# Altium footprint library BBC_Connectors.PcbLib: 141 footprints (part 8 of 9)
Each footprint in its own frame and in the unit in brackets; x right, y up, seen from the top. Pads: shape width x height; smd on the part's side, far side on the other; paste and mask are expansions set on the pad; w line width, h text height; cw(c..) or ccw(c..) is an arc to the next point about the centre after c.
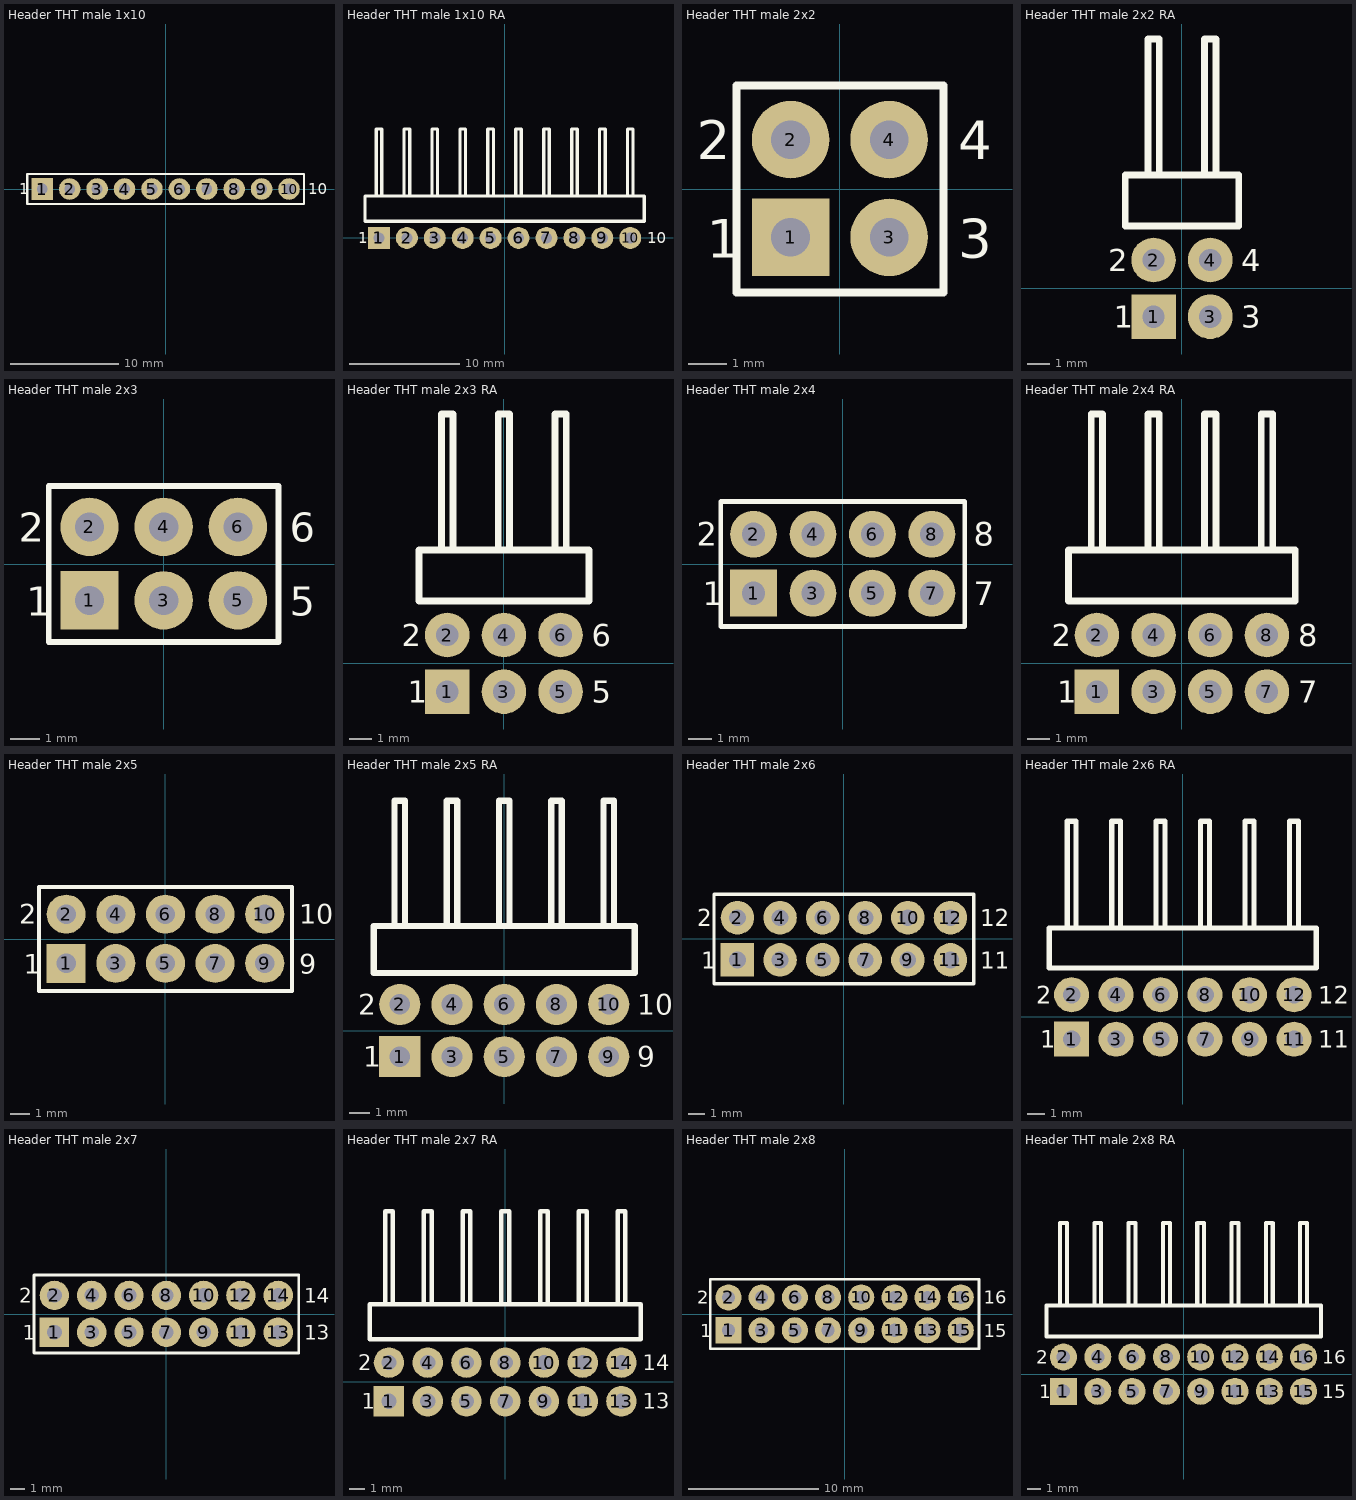
[diagram p7: the footprints below, top view; thin cyan lines are the x and y axes]

## Header THT male 1x10 [mm] "header for tht mounting / pitch = 2.54mm"
height 9
pads (10):
  rect 2x2 hole 1: 1(-11.43,0)
  round 2 hole 1: 2(-8.89,0) 3(-6.35,0) 4(-3.81,0) 5(-1.27,0) 6(1.27,0) 7(3.81,0) 8(6.35,0) 9(8.89,0) 10(11.43,0)
Top Overlay:
  lines w0.2: -12.827,-1.397 12.827,-1.397 12.827,1.397 -12.827,1.397 -12.827,-1.397
  text "1" at -13.589,-0.5 h1
  text "10" at 13.208,-0.5 h1
3D body: height 2.51, standoff -3, extent 2.54,3.81 2.54,3.81
3D body "Header THT 1x10.STEP": height 8.54, standoff -3, extent -12.7,-1.245 12.7,1.245

## Header THT male 1x10 RA [mm] "right angle header for tht mounting / pitch = 2.54mm"
height 2.5
pads (10):
  rect 2x2 hole 1: 1(-11.43,0)
  round 2 hole 1: 2(-8.89,0) 3(-6.35,0) 4(-3.81,0) 5(-1.27,0) 6(1.27,0) 7(3.81,0) 8(6.35,0) 9(8.89,0) 10(11.43,0)
Top Overlay:
  lines w0.3: -11.684,3.81 -11.684,9.906 -11.176,9.906 -11.176,3.81 ; -9.144,3.81 -9.144,9.906 -8.636,9.906 -8.636,3.81 ; -6.604,3.81 -6.604,9.906 -6.096,9.906 -6.096,3.81 ; -4.064,3.81 -4.064,9.906 -3.556,9.906 -3.556,3.81 ; -1.524,3.81 -1.524,9.906 -1.016,9.906 -1.016,3.81 ; 1.016,3.81 1.016,9.906 1.524,9.906 1.524,3.81 ; 3.556,3.81 3.556,9.906 4.064,9.906 4.064,3.81 ; 6.096,3.81 6.096,9.906 6.604,9.906 6.604,3.81 ; 8.636,3.81 8.636,9.906 9.144,9.906 9.144,3.81 ; 11.176,3.81 11.176,9.906 11.684,9.906 11.684,3.81 ; -12.7,1.524 -12.7,3.81 12.7,3.81 12.7,1.524 -12.7,1.524
  text "10" at 12.954,-0.5 h1
  text "1" at -13.335,-0.5 h1
3D body "Header THT 1x10 RA.STEP": height 2.51, standoff -3, extent -12.7,-0.32 12.7,9.81

## Header THT male 2x2 [mm] "header for tht mounting / pitch = 2.54mm"
height 9
pads (4):
  rect 2x2 hole 1: 1(-1.27,-1.245)
  round 2 hole 1: 2(-1.27,1.27) 3(1.27,-1.245) 4(1.27,1.27)
Top Overlay:
  lines w0.2: -2.667,-2.667 -2.667,2.667 2.667,2.667 2.667,-2.667 -2.667,-2.667
  text "2" at -3.683,0.77 h1
  text "4" at 3.048,0.77 h1
  text "3" at 3.048,-1.77 h1
  text "1" at -3.429,-1.77 h1
3D body: height 2.51, standoff -3, extent 2.54,3.81 2.54,3.81
3D body "Header THT male 2x2.step": height 8.54, standoff -3, extent -2.54,-2.49 2.54,2.5

## Header THT male 2x2 RA [mm] "right angle header for tht mounting / pitch = 2.54mm"
height 2.5
pads (4):
  rect 2x2 hole 1: 1(-1.27,-1.27)
  round 2 hole 1: 2(-1.27,1.27) 3(1.27,-1.27) 4(1.27,1.27)
Top Overlay:
  lines w0.3: -1.524,5.08 -1.524,11.176 -1.016,11.176 -1.016,5.08 ; 1.016,5.08 1.016,11.176 1.524,11.176 1.524,5.08 ; -2.54,2.794 2.54,2.794 2.54,5.08 -2.54,5.08 -2.54,2.794
  text "1" at -3.048,-1.77 h1
  text "2" at -3.302,0.77 h1
  text "4" at 2.667,0.77 h1
  text "3" at 2.667,-1.77 h1
3D body "Header THT 2x2 RA.step": height 5.01, standoff -3, extent -2.54,-1.55 2.54,11.08

## Header THT male 2x3 [mm] "header for tht mounting / pitch = 2.54mm"
height 9
pads (6):
  rect 2x2 hole 1: 1(-2.54,-1.245)
  round 2 hole 1: 2(-2.54,1.27) 3(0,-1.245) 4(0,1.27) 5(2.54,-1.245) 6(2.54,1.27)
Top Overlay:
  lines w0.2: -3.937,-2.667 3.937,-2.667 3.937,2.667 -3.937,2.667 -3.937,-2.667
  text "1" at -4.699,-1.77 h1
  text "5" at 4.318,-1.77 h1
  text "6" at 4.318,0.77 h1
  text "2" at -4.953,0.77 h1
3D body: height 2.51, standoff -3, extent 2.54,3.81 2.54,3.81
3D body "Header THT 2x3.step": height 8.54, standoff -3, extent -3.81,-2.49 3.81,2.5

## Header THT male 2x3 RA [mm] "right angle header for tht mounting / pitch = 2.54mm"
height 2.5
pads (6):
  rect 2x2 hole 1: 1(-2.54,-1.27)
  round 2 hole 1: 2(-2.54,1.27) 3(0,-1.27) 4(0,1.27) 5(2.54,-1.27) 6(2.54,1.27)
Top Overlay:
  lines w0.3: -2.794,5.08 -2.794,11.176 -2.286,11.176 -2.286,5.08 ; -0.254,5.08 -0.254,11.176 0.254,11.176 0.254,5.08 ; 2.286,5.08 2.286,11.176 2.794,11.176 2.794,5.08 ; -3.81,2.794 -3.81,5.08 3.81,5.08 3.81,2.794 -3.81,2.794
  text "5" at 3.937,-1.77 h1
  text "6" at 3.937,0.77 h1
  text "2" at -4.572,0.77 h1
  text "1" at -4.318,-1.77 h1
3D body "Header THT 2x3 RA.step": height 5.01, standoff -3, extent -3.81,-1.55 3.81,11.08

## Header THT male 2x4 [mm] "header for tht mounting / pitch = 2.54mm"
height 9
pads (8):
  rect 2x2 hole 1: 1(-3.81,-1.245)
  round 2 hole 1: 2(-3.81,1.27) 3(-1.27,-1.245) 4(-1.27,1.27) 5(1.27,-1.245) 6(1.27,1.27) 7(3.81,-1.245) 8(3.81,1.27)
Top Overlay:
  lines w0.2: -5.207,-2.667 -5.207,2.667 5.207,2.667 5.207,-2.667 -5.207,-2.667
  text "1" at -5.969,-1.77 h1
  text "7" at 5.588,-1.77 h1
  text "8" at 5.588,0.77 h1
  text "2" at -6.223,0.77 h1
3D body "Header THT 2x4.step": height 8.54, standoff -3, extent -5.08,-2.49 5.08,2.5
3D body: height 2.51, standoff -3, extent 2.54,3.81 2.54,3.81

## Header THT male 2x4 RA [mm] "right angle header for tht mounting / pitch = 2.54mm"
height 2.5
pads (8):
  rect 2x2 hole 1: 1(-3.81,-1.27)
  round 2 hole 1: 2(-3.81,1.27) 3(-1.27,-1.27) 4(-1.27,1.27) 5(1.27,-1.27) 6(1.27,1.27) 7(3.81,-1.27) 8(3.81,1.27)
Top Overlay:
  lines w0.3: -4.064,5.08 -4.064,11.176 -3.556,11.176 -3.556,5.08 ; -1.524,5.08 -1.524,11.176 -1.016,11.176 -1.016,5.08 ; 1.016,5.08 1.016,11.176 1.524,11.176 1.524,5.08 ; 3.556,5.08 3.556,11.176 4.064,11.176 4.064,5.08 ; -5.08,2.794 -5.08,5.08 5.08,5.08 5.08,2.794 -5.08,2.794
  text "7" at 5.207,-1.77 h1
  text "8" at 5.207,0.77 h1
  text "2" at -5.842,0.77 h1
  text "1" at -5.588,-1.77 h1
3D body "Header THT 2x4 RA.step": height 5.01, standoff -3, extent -5.08,-1.55 5.08,11.08

## Header THT male 2x5 [mm] "header for tht mounting / pitch = 2.54mm"
height 9
pads (10):
  rect 2x2 hole 1: 1(-5.08,-1.245)
  round 2 hole 1: 2(-5.08,1.27) 3(-2.54,-1.245) 4(-2.54,1.27) 5(0,-1.245) 6(0,1.27) 7(2.54,-1.245) 8(2.54,1.27) 9(5.08,-1.245) 10(5.08,1.27)
Top Overlay:
  lines w0.2: -6.477,-2.667 -6.477,2.667 6.477,2.667 6.477,-2.667 -6.477,-2.667
  text "2" at -7.493,0.77 h1
  text "10" at 6.858,0.77 h1
  text "9" at 6.858,-1.77 h1
  text "1" at -7.239,-1.77 h1
3D body: height 2.51, standoff -3, extent 2.54,3.81 2.54,3.81
3D body "Header THT 2x5.step": height 8.54, standoff -3, extent -6.35,-2.49 6.35,2.5

## Header THT male 2x5 RA [mm] "right angle header for tht mounting / pitch = 2.54mm"
height 2.5
pads (10):
  rect 2x2 hole 1: 1(-5.08,-1.27)
  round 2 hole 1: 2(-5.08,1.27) 3(-2.54,-1.27) 4(-2.54,1.27) 5(0,-1.27) 6(0,1.27) 7(2.54,-1.27) 8(2.54,1.27) 9(5.08,-1.27) 10(5.08,1.27)
Top Overlay:
  lines w0.3: -5.334,5.08 -5.334,11.176 -4.826,11.176 -4.826,5.08 ; -2.794,5.08 -2.794,11.176 -2.286,11.176 -2.286,5.08 ; -0.254,5.08 -0.254,11.176 0.254,11.176 0.254,5.08 ; 2.286,5.08 2.286,11.176 2.794,11.176 2.794,5.08 ; 4.826,5.08 4.826,11.176 5.334,11.176 5.334,5.08 ; -6.35,2.794 6.35,2.794 6.35,5.08 -6.35,5.08 -6.35,2.794
  text "1" at -6.858,-1.77 h1
  text "2" at -7.112,0.77 h1
  text "10" at 6.477,0.77 h1
  text "9" at 6.477,-1.77 h1
3D body "Header THT 2x5 RA.step": height 5.01, standoff -3, extent -6.35,-1.55 6.35,11.08

## Header THT male 2x6 [mm] "header for tht mounting / pitch = 2.54mm"
height 9
pads (12):
  rect 2x2 hole 1: 1(-6.35,-1.245)
  round 2 hole 1: 2(-6.35,1.27) 3(-3.81,-1.245) 4(-3.81,1.27) 5(-1.27,-1.245) 6(-1.27,1.27) 7(1.27,-1.245) 8(1.27,1.27) 9(3.81,-1.245) 10(3.81,1.27) 11(6.35,-1.245) 12(6.35,1.27)
Top Overlay:
  lines w0.2: -7.747,-2.667 -7.747,2.667 7.747,2.667 7.747,-2.667 -7.747,-2.667
  text "1" at -8.509,-1.77 h1
  text "11" at 8.128,-1.77 h1
  text "12" at 8.128,0.77 h1
  text "2" at -8.763,0.77 h1
3D body: height 2.51, standoff -3, extent 2.54,3.81 2.54,3.81
3D body "Header THT 2x6.step": height 8.54, standoff -3, extent -7.62,-2.49 7.62,2.5

## Header THT male 2x6 RA [mm] "right angle header for tht mounting / pitch = 2.54mm"
height 2.5
pads (12):
  rect 2x2 hole 1: 1(-6.35,-1.27)
  round 2 hole 1: 2(-6.35,1.27) 3(-3.81,-1.27) 4(-3.81,1.27) 5(-1.27,-1.27) 6(-1.27,1.27) 7(1.27,-1.27) 8(1.27,1.27) 9(3.81,-1.27) 10(3.81,1.27) 11(6.35,-1.27) 12(6.35,1.27)
Top Overlay:
  lines w0.3: -6.604,5.08 -6.604,11.176 -6.096,11.176 -6.096,5.08 ; -4.064,5.08 -4.064,11.176 -3.556,11.176 -3.556,5.08 ; -1.524,5.08 -1.524,11.176 -1.016,11.176 -1.016,5.08 ; 1.016,5.08 1.016,11.176 1.524,11.176 1.524,5.08 ; 3.556,5.08 3.556,11.176 4.064,11.176 4.064,5.08 ; 6.096,5.08 6.096,11.176 6.604,11.176 6.604,5.08 ; -7.62,2.794 7.62,2.794 7.62,5.08 -7.62,5.08 -7.62,2.794
  text "1" at -8.128,-1.77 h1
  text "2" at -8.382,0.77 h1
  text "12" at 7.747,0.77 h1
  text "11" at 7.747,-1.77 h1
3D body "Header THT 2x6 RA.step": height 5.01, standoff -3, extent -7.62,-1.55 7.62,11.08

## Header THT male 2x7 [mm] "header for tht mounting / pitch = 2.54mm"
height 9
pads (14):
  rect 2x2 hole 1: 1(-7.62,-1.245)
  round 2 hole 1: 2(-7.62,1.27) 3(-5.08,-1.245) 4(-5.08,1.27) 5(-2.54,-1.245) 6(-2.54,1.27) 7(0,-1.245) 8(0,1.27) 9(2.54,-1.245) 10(2.54,1.27) 11(5.08,-1.245) 12(5.08,1.27) 13(7.62,-1.245) 14(7.62,1.27)
Top Overlay:
  lines w0.2: -9.017,-2.667 -9.017,2.667 9.017,2.667 9.017,-2.667 -9.017,-2.667
  text "1" at -9.779,-1.77 h1
  text "13" at 9.398,-1.77 h1
  text "14" at 9.398,0.77 h1
  text "2" at -10.033,0.77 h1
3D body "Header THT 2x7.step": height 8.54, standoff -3, extent -8.89,-2.49 8.89,2.5
3D body: height 2.51, standoff -3, extent 2.54,3.81 2.54,3.81

## Header THT male 2x7 RA [mm] "right angle header for tht mounting / pitch = 2.54mm"
height 2.5
pads (14):
  rect 2x2 hole 1: 1(-7.62,-1.27)
  round 2 hole 1: 2(-7.62,1.27) 3(-5.08,-1.27) 4(-5.08,1.27) 5(-2.54,-1.27) 6(-2.54,1.27) 7(0,-1.27) 8(0,1.27) 9(2.54,-1.27) 10(2.54,1.27) 11(5.08,-1.27) 12(5.08,1.27) 13(7.62,-1.27) 14(7.62,1.27)
Top Overlay:
  lines w0.3: -7.874,5.08 -7.874,11.176 -7.366,11.176 -7.366,5.08 ; -5.334,5.08 -5.334,11.176 -4.826,11.176 -4.826,5.08 ; -2.794,5.08 -2.794,11.176 -2.286,11.176 -2.286,5.08 ; -0.254,5.08 -0.254,11.176 0.254,11.176 0.254,5.08 ; 2.286,5.08 2.286,11.176 2.794,11.176 2.794,5.08 ; 4.826,5.08 4.826,11.176 5.334,11.176 5.334,5.08 ; 7.366,5.08 7.366,11.176 7.874,11.176 7.874,5.08 ; -8.89,2.794 8.89,2.794 8.89,5.08 -8.89,5.08 -8.89,2.794
  text "1" at -9.398,-1.77 h1
  text "2" at -9.652,0.77 h1
  text "14" at 9.017,0.77 h1
  text "13" at 9.017,-1.77 h1
3D body "Header THT 2x7 RA.step": height 5.01, standoff -3, extent -8.89,-1.55 8.89,11.08

## Header THT male 2x8 [mm] "header for tht mounting / pitch = 2.54mm"
height 9
pads (16):
  rect 2x2 hole 1: 1(-8.89,-1.245)
  round 2 hole 1: 2(-8.89,1.27) 3(-6.35,-1.245) 4(-6.35,1.27) 5(-3.81,-1.245) 6(-3.81,1.27) 7(-1.27,-1.245) 8(-1.27,1.27) 9(1.27,-1.245) 10(1.27,1.27) 11(3.81,-1.245) 12(3.81,1.27) 13(6.35,-1.245) 14(6.35,1.27) 15(8.89,-1.245) 16(8.89,1.27)
Top Overlay:
  lines w0.2: -10.287,-2.667 10.287,-2.667 10.287,2.667 -10.287,2.667 -10.287,-2.667
  text "2" at -11.303,0.77 h1
  text "16" at 10.668,0.77 h1
  text "15" at 10.668,-1.77 h1
  text "1" at -11.049,-1.77 h1
3D body "Header THT 2x8.step": height 8.54, standoff -3, extent -10.16,-2.49 10.16,2.5
3D body: height 2.51, standoff -3, extent 2.54,3.81 2.54,3.81

## Header THT male 2x8 RA [mm] "right angle header for tht mounting / pitch = 2.54mm"
height 2.5
pads (16):
  rect 2x2 hole 1: 1(-8.89,-1.27)
  round 2 hole 1: 2(-8.89,1.27) 3(-6.35,-1.27) 4(-6.35,1.27) 5(-3.81,-1.27) 6(-3.81,1.27) 7(-1.27,-1.27) 8(-1.27,1.27) 9(1.27,-1.27) 10(1.27,1.27) 11(3.81,-1.27) 12(3.81,1.27) 13(6.35,-1.27) 14(6.35,1.27) 15(8.89,-1.27) 16(8.89,1.27)
Top Overlay:
  lines w0.3: -9.144,5.08 -9.144,11.176 -8.636,11.176 -8.636,5.08 ; -6.604,5.08 -6.604,11.176 -6.096,11.176 -6.096,5.08 ; -4.064,5.08 -4.064,11.176 -3.556,11.176 -3.556,5.08 ; -1.524,5.08 -1.524,11.176 -1.016,11.176 -1.016,5.08 ; 1.016,5.08 1.016,11.176 1.524,11.176 1.524,5.08 ; 3.556,5.08 3.556,11.176 4.064,11.176 4.064,5.08 ; 6.096,5.08 6.096,11.176 6.604,11.176 6.604,5.08 ; 8.636,5.08 8.636,11.176 9.144,11.176 9.144,5.08 ; -10.16,2.794 10.16,2.794 10.16,5.08 -10.16,5.08 -10.16,2.794
  text "1" at -10.668,-1.77 h1
  text "2" at -10.922,0.77 h1
  text "16" at 10.287,0.77 h1
  text "15" at 10.287,-1.77 h1
3D body "Header THT 2x8 RA.step": height 5.01, standoff -3, extent -10.16,-1.55 10.16,11.08